# Altium schematic symbol library jlcpcb_2025_04_capacitors_extended_0603.schlib: 3668 symbols (part 6 of 20) (continued)
## AC0603JRNPO9BN151
designator C?  Capacitance: 150pF  (hidden comment: *)
Capacitor, Ceramic (MLCC), 150pF, ±5%, 50V, NP0, ±5%, SMD 0603; Manufacturer: YAGEO; Manufacturer Part Number: AC0603JRNPO9BN151; Package Size: 0603; JLCPCB Basic Part: No; JLCPCB Part Number: C327123; Supplier 1: LCSC; Category: Capacitors - MLCC; Supplier Part Number 1: C327123; Tolerance: ±5%; Voltage Rating: 50V; Temperature Coefficient: NP0; RoHS: Yes; ComponentLink1Description: Datasheet; ComponentLink1URL: https://wmsc.lcsc.com/wmsc/upload/file/pdf/v2/lcsc/1811141225_YAGEO-AC0603JRNPO9BN151_C327123.pdf; ComponentLink2Description: JLCPCB Part URL; ComponentLink2URL: https://jlcpcb.com/partdetail/C327123; ComponentLink3Description: LCSC Part URL; ComponentLink3URL: https://lcsc.com/product-detail/Multilayer-Ceramic-Capacitors-MLCC---SMD-SMT_YAGEO-YAGEO-AC0603JRNPO9BN151_C327123.html
footprint CAP-0603 (0603 (1608M) Capacitor)
pins: 1, 2

## AC0603JRNPO9BN160
designator C?  Capacitance: 16pF  (hidden comment: *)
Capacitor, Ceramic (MLCC), 16pF, ±5%, 50V, NP0, ±5%, SMD 0603; Manufacturer: YAGEO; Manufacturer Part Number: AC0603JRNPO9BN160; Package Size: 0603; JLCPCB Basic Part: No; JLCPCB Part Number: C726546; Supplier 1: LCSC; Category: Capacitors - MLCC; Supplier Part Number 1: C726546; Tolerance: ±5%; Voltage Rating: 50V; Temperature Coefficient: NP0; RoHS: Yes; ComponentLink1Description: Datasheet; ComponentLink1URL: https://wmsc.lcsc.com/wmsc/upload/file/pdf/v2/lcsc/2011091835_YAGEO-AC0603JRNPO9BN160_C726546.pdf; ComponentLink2Description: JLCPCB Part URL; ComponentLink2URL: https://jlcpcb.com/partdetail/C726546; ComponentLink3Description: LCSC Part URL; ComponentLink3URL: https://lcsc.com/product-detail/Multilayer-Ceramic-Capacitors-MLCC---SMD-SMT_YAGEO-YAGEO-AC0603JRNPO9BN160_C726546.html
footprint CAP-0603 (0603 (1608M) Capacitor)
pins: 1, 2

## AC0603JRNPO9BN180
designator C?  Capacitance: 18pF  (hidden comment: *)
Capacitor, Ceramic (MLCC), 18pF, ±5%, 50V, NP0, ±5%, SMD 0603; Manufacturer: YAGEO; Manufacturer Part Number: AC0603JRNPO9BN180; Package Size: 0603; JLCPCB Basic Part: No; JLCPCB Part Number: C389109; Supplier 1: LCSC; Category: Capacitors - MLCC; Supplier Part Number 1: C389109; Tolerance: ±5%; Voltage Rating: 50V; Temperature Coefficient: NP0; RoHS: Yes; ComponentLink1Description: Datasheet; ComponentLink1URL: https://wmsc.lcsc.com/wmsc/upload/file/pdf/v2/lcsc/1912111437_YAGEO-AC0603JRNPO9BN180_C389109.pdf; ComponentLink2Description: JLCPCB Part URL; ComponentLink2URL: https://jlcpcb.com/partdetail/C389109; ComponentLink3Description: LCSC Part URL; ComponentLink3URL: https://lcsc.com/product-detail/Multilayer-Ceramic-Capacitors-MLCC---SMD-SMT_YAGEO-YAGEO-AC0603JRNPO9BN180_C389109.html
footprint CAP-0603 (0603 (1608M) Capacitor)
pins: 1, 2

## AC0603JRNPO9BN181
designator C?  Capacitance: 180pF  (hidden comment: *)
Capacitor, Ceramic (MLCC), 180pF, ±5%, 50V, NP0, ±5%, SMD 0603; Manufacturer: YAGEO; Manufacturer Part Number: AC0603JRNPO9BN181; Package Size: 0603; JLCPCB Basic Part: No; JLCPCB Part Number: C2197070; Supplier 1: LCSC; Category: Capacitors - MLCC; Supplier Part Number 1: C2197070; Tolerance: ±5%; Voltage Rating: 50V; Temperature Coefficient: NP0; RoHS: Yes; ComponentLink1Description: Datasheet; ComponentLink1URL: https://wmsc.lcsc.com/wmsc/upload/file/pdf/v2/lcsc/2304140030_YAGEO-AC0603JRNPO9BN181_C2197070.pdf; ComponentLink2Description: JLCPCB Part URL; ComponentLink2URL: https://jlcpcb.com/partdetail/C2197070; ComponentLink3Description: LCSC Part URL; ComponentLink3URL: https://lcsc.com/product-detail/Multilayer-Ceramic-Capacitors-MLCC---SMD-SMT_YAGEO-YAGEO-AC0603JRNPO9BN181_C2197070.html
footprint CAP-0603 (0603 (1608M) Capacitor)
pins: 1, 2

## AC0603JRNPO9BN200
designator C?  Capacitance: 20pF  (hidden comment: *)
Capacitor, Ceramic (MLCC), 20pF, ±5%, 50V, NP0, ±5%, SMD 0603; Manufacturer: YAGEO; Manufacturer Part Number: AC0603JRNPO9BN200; Package Size: 0603; JLCPCB Basic Part: No; JLCPCB Part Number: C149610; Supplier 1: LCSC; Category: Capacitors - MLCC; Supplier Part Number 1: C149610; Tolerance: ±5%; Voltage Rating: 50V; Temperature Coefficient: NP0; RoHS: Yes; ComponentLink1Description: Datasheet; ComponentLink1URL: https://wmsc.lcsc.com/wmsc/upload/file/pdf/v2/lcsc/2304140030_YAGEO-AC0603JRNPO9BN200_C149610.pdf; ComponentLink2Description: JLCPCB Part URL; ComponentLink2URL: https://jlcpcb.com/partdetail/C149610; ComponentLink3Description: LCSC Part URL; ComponentLink3URL: https://lcsc.com/product-detail/Multilayer-Ceramic-Capacitors-MLCC---SMD-SMT_YAGEO-YAGEO-AC0603JRNPO9BN200_C149610.html
footprint CAP-0603 (0603 (1608M) Capacitor)
pins: 1, 2

## AC0603JRNPO9BN220
designator C?  Capacitance: 22pF  (hidden comment: *)
Capacitor, Ceramic (MLCC), 22pF, ±5%, 50V, NP0, ±5%, SMD 0603; Manufacturer: YAGEO; Manufacturer Part Number: AC0603JRNPO9BN220; Package Size: 0603; JLCPCB Basic Part: No; JLCPCB Part Number: C309441; Supplier 1: LCSC; Category: Capacitors - MLCC; Supplier Part Number 1: C309441; Tolerance: ±5%; Voltage Rating: 50V; Temperature Coefficient: NP0; RoHS: Yes; ComponentLink1Description: Datasheet; ComponentLink1URL: https://wmsc.lcsc.com/wmsc/upload/file/pdf/v2/lcsc/2304140030_YAGEO-AC0603JRNPO9BN220_C309441.pdf; ComponentLink2Description: JLCPCB Part URL; ComponentLink2URL: https://jlcpcb.com/partdetail/C309441; ComponentLink3Description: LCSC Part URL; ComponentLink3URL: https://lcsc.com/product-detail/Multilayer-Ceramic-Capacitors-MLCC---SMD-SMT_YAGEO-YAGEO-AC0603JRNPO9BN220_C309441.html
footprint CAP-0603 (0603 (1608M) Capacitor)
pins: 1, 2

## AC0603JRNPO9BN221
designator C?  Capacitance: 220pF  (hidden comment: *)
Capacitor, Ceramic (MLCC), 220pF, ±5%, 50V, NP0, ±5%, SMD 0603; Manufacturer: YAGEO; Manufacturer Part Number: AC0603JRNPO9BN221; Package Size: 0603; JLCPCB Basic Part: No; JLCPCB Part Number: C723993; Supplier 1: LCSC; Category: Capacitors - MLCC; Supplier Part Number 1: C723993; Tolerance: ±5%; Voltage Rating: 50V; Temperature Coefficient: NP0; RoHS: Yes; ComponentLink1Description: Datasheet; ComponentLink1URL: https://wmsc.lcsc.com/wmsc/upload/file/pdf/v2/lcsc/2009261809_YAGEO-AC0603JRNPO9BN221_C723993.pdf; ComponentLink2Description: JLCPCB Part URL; ComponentLink2URL: https://jlcpcb.com/partdetail/C723993; ComponentLink3Description: LCSC Part URL; ComponentLink3URL: https://lcsc.com/product-detail/Multilayer-Ceramic-Capacitors-MLCC---SMD-SMT_YAGEO-YAGEO-AC0603JRNPO9BN221_C723993.html
footprint CAP-0603 (0603 (1608M) Capacitor)
pins: 1, 2

## AC0603JRNPO9BN271
designator C?  Capacitance: 270pF  (hidden comment: *)
Capacitor, Ceramic (MLCC), 270pF, ±5%, 50V, NP0, ±5%, SMD 0603; Manufacturer: YAGEO; Manufacturer Part Number: AC0603JRNPO9BN271; Package Size: 0603; JLCPCB Basic Part: No; JLCPCB Part Number: C726547; Supplier 1: LCSC; Category: Capacitors - MLCC; Supplier Part Number 1: C726547; Tolerance: ±5%; Voltage Rating: 50V; Temperature Coefficient: NP0; RoHS: Yes; ComponentLink1Description: Datasheet; ComponentLink1URL: https://wmsc.lcsc.com/wmsc/upload/file/pdf/v2/lcsc/2009191609_YAGEO-AC0603JRNPO9BN271_C726547.pdf; ComponentLink2Description: JLCPCB Part URL; ComponentLink2URL: https://jlcpcb.com/partdetail/C726547; ComponentLink3Description: LCSC Part URL; ComponentLink3URL: https://lcsc.com/product-detail/Multilayer-Ceramic-Capacitors-MLCC---SMD-SMT_YAGEO-YAGEO-AC0603JRNPO9BN271_C726547.html
footprint CAP-0603 (0603 (1608M) Capacitor)
pins: 1, 2

## AC0603JRNPO9BN330
designator C?  Capacitance: 33pF  (hidden comment: *)
Capacitor, Ceramic (MLCC), 33pF, ±5%, 50V, NP0, ±5%, SMD 0603; Manufacturer: YAGEO; Manufacturer Part Number: AC0603JRNPO9BN330; Package Size: 0603; JLCPCB Basic Part: No; JLCPCB Part Number: C327017; Supplier 1: LCSC; Category: Capacitors - MLCC; Supplier Part Number 1: C327017; Tolerance: ±5%; Voltage Rating: 50V; Temperature Coefficient: NP0; RoHS: Yes; ComponentLink1Description: Datasheet; ComponentLink1URL: https://wmsc.lcsc.com/wmsc/upload/file/pdf/v2/lcsc/1811141225_YAGEO-AC0603JRNPO9BN330_C327017.pdf; ComponentLink2Description: JLCPCB Part URL; ComponentLink2URL: https://jlcpcb.com/partdetail/C327017; ComponentLink3Description: LCSC Part URL; ComponentLink3URL: https://lcsc.com/product-detail/Multilayer-Ceramic-Capacitors-MLCC---SMD-SMT_YAGEO-YAGEO-AC0603JRNPO9BN330_C327017.html
footprint CAP-0603 (0603 (1608M) Capacitor)
pins: 1, 2

## AC0603JRNPO9BN331
designator C?  Capacitance: 330pF  (hidden comment: *)
Capacitor, Ceramic (MLCC), 330pF, ±5%, 50V, NP0, ±5%, SMD 0603; Manufacturer: YAGEO; Manufacturer Part Number: AC0603JRNPO9BN331; Package Size: 0603; JLCPCB Basic Part: No; JLCPCB Part Number: C605209; Supplier 1: LCSC; Category: Capacitors - MLCC; Supplier Part Number 1: C605209; Tolerance: ±5%; Voltage Rating: 50V; Temperature Coefficient: NP0; RoHS: Yes; ComponentLink1Description: Datasheet; ComponentLink1URL: https://wmsc.lcsc.com/wmsc/upload/file/pdf/v2/lcsc/2304140030_YAGEO-AC0603JRNPO9BN331_C605209.pdf; ComponentLink2Description: JLCPCB Part URL; ComponentLink2URL: https://jlcpcb.com/partdetail/C605209; ComponentLink3Description: LCSC Part URL; ComponentLink3URL: https://lcsc.com/product-detail/Multilayer-Ceramic-Capacitors-MLCC---SMD-SMT_YAGEO-YAGEO-AC0603JRNPO9BN331_C605209.html
footprint CAP-0603 (0603 (1608M) Capacitor)
pins: 1, 2

## AC0603JRNPO9BN390
designator C?  Capacitance: 39pF  (hidden comment: *)
Capacitor, Ceramic (MLCC), 39pF, ±5%, 50V, NP0, ±5%, SMD 0603; Manufacturer: YAGEO; Manufacturer Part Number: AC0603JRNPO9BN390; Package Size: 0603; JLCPCB Basic Part: No; JLCPCB Part Number: C2180849; Supplier 1: LCSC; Category: Capacitors - MLCC; Supplier Part Number 1: C2180849; Tolerance: ±5%; Voltage Rating: 50V; Temperature Coefficient: NP0; RoHS: Yes; ComponentLink1Description: Datasheet; ComponentLink1URL: https://wmsc.lcsc.com/wmsc/upload/file/pdf/v2/lcsc/2202041130_YAGEO-AC0603JRNPO9BN390_C2180849.pdf; ComponentLink2Description: JLCPCB Part URL; ComponentLink2URL: https://jlcpcb.com/partdetail/C2180849; ComponentLink3Description: LCSC Part URL; ComponentLink3URL: https://lcsc.com/product-detail/Multilayer-Ceramic-Capacitors-MLCC---SMD-SMT_YAGEO-YAGEO-AC0603JRNPO9BN390_C2180849.html
footprint CAP-0603 (0603 (1608M) Capacitor)
pins: 1, 2

## AC0603JRNPO9BN391
designator C?  Capacitance: 390pF  (hidden comment: *)
Capacitor, Ceramic (MLCC), 390pF, ±5%, 50V, NP0, ±5%, SMD 0603; Manufacturer: YAGEO; Manufacturer Part Number: AC0603JRNPO9BN391; Package Size: 0603; JLCPCB Basic Part: No; JLCPCB Part Number: C327023; Supplier 1: LCSC; Category: Capacitors - MLCC; Supplier Part Number 1: C327023; Tolerance: ±5%; Voltage Rating: 50V; Temperature Coefficient: NP0; RoHS: Yes; ComponentLink1Description: Datasheet; ComponentLink1URL: https://wmsc.lcsc.com/wmsc/upload/file/pdf/v2/lcsc/1811141234_YAGEO-AC0603JRNPO9BN391_C327023.pdf; ComponentLink2Description: JLCPCB Part URL; ComponentLink2URL: https://jlcpcb.com/partdetail/C327023; ComponentLink3Description: LCSC Part URL; ComponentLink3URL: https://lcsc.com/product-detail/Multilayer-Ceramic-Capacitors-MLCC---SMD-SMT_YAGEO-YAGEO-AC0603JRNPO9BN391_C327023.html
footprint CAP-0603 (0603 (1608M) Capacitor)
pins: 1, 2

## AC0603JRNPO9BN470
designator C?  Capacitance: 47pF  (hidden comment: *)
Capacitor, Ceramic (MLCC), 47pF, ±5%, 50V, NP0, ±5%, SMD 0603; Manufacturer: YAGEO; Manufacturer Part Number: AC0603JRNPO9BN470; Package Size: 0603; JLCPCB Basic Part: No; JLCPCB Part Number: C149616; Supplier 1: LCSC; Category: Capacitors - MLCC; Supplier Part Number 1: C149616; Tolerance: ±5%; Voltage Rating: 50V; Temperature Coefficient: NP0; RoHS: Yes; ComponentLink1Description: Datasheet; ComponentLink1URL: https://wmsc.lcsc.com/wmsc/upload/file/pdf/v2/lcsc/2304140030_YAGEO-AC0603JRNPO9BN470_C149616.pdf; ComponentLink2Description: JLCPCB Part URL; ComponentLink2URL: https://jlcpcb.com/partdetail/C149616; ComponentLink3Description: LCSC Part URL; ComponentLink3URL: https://lcsc.com/product-detail/Multilayer-Ceramic-Capacitors-MLCC---SMD-SMT_YAGEO-YAGEO-AC0603JRNPO9BN470_C149616.html
footprint CAP-0603 (0603 (1608M) Capacitor)
pins: 1, 2

## AC0603JRNPO9BN471
designator C?  Capacitance: 470pF  (hidden comment: *)
Capacitor, Ceramic (MLCC), 470pF, ±5%, 50V, NP0, ±5%, SMD 0603; Manufacturer: YAGEO; Manufacturer Part Number: AC0603JRNPO9BN471; Package Size: 0603; JLCPCB Basic Part: No; JLCPCB Part Number: C326950; Supplier 1: LCSC; Category: Capacitors - MLCC; Supplier Part Number 1: C326950; Tolerance: ±5%; Voltage Rating: 50V; Temperature Coefficient: NP0; RoHS: Yes; ComponentLink1Description: Datasheet; ComponentLink1URL: https://wmsc.lcsc.com/wmsc/upload/file/pdf/v2/lcsc/1811141226_YAGEO-AC0603JRNPO9BN471_C326950.pdf; ComponentLink2Description: JLCPCB Part URL; ComponentLink2URL: https://jlcpcb.com/partdetail/C326950; ComponentLink3Description: LCSC Part URL; ComponentLink3URL: https://lcsc.com/product-detail/Multilayer-Ceramic-Capacitors-MLCC---SMD-SMT_YAGEO-YAGEO-AC0603JRNPO9BN471_C326950.html
footprint CAP-0603 (0603 (1608M) Capacitor)
pins: 1, 2

## AC0603JRNPO9BN560
designator C?  Capacitance: 56pF  (hidden comment: *)
Capacitor, Ceramic (MLCC), 56pF, ±5%, 50V, NP0, ±5%, SMD 0603; Manufacturer: YAGEO; Manufacturer Part Number: AC0603JRNPO9BN560; Package Size: 0603; JLCPCB Basic Part: No; JLCPCB Part Number: C2191164; Supplier 1: LCSC; Category: Capacitors - MLCC; Supplier Part Number 1: C2191164; Tolerance: ±5%; Voltage Rating: 50V; Temperature Coefficient: NP0; RoHS: Yes; ComponentLink1Description: Datasheet; ComponentLink1URL: https://wmsc.lcsc.com/wmsc/upload/file/pdf/v2/lcsc/2304140030_YAGEO-AC0603JRNPO9BN560_C2191164.pdf; ComponentLink2Description: JLCPCB Part URL; ComponentLink2URL: https://jlcpcb.com/partdetail/C2191164; ComponentLink3Description: LCSC Part URL; ComponentLink3URL: https://lcsc.com/product-detail/Multilayer-Ceramic-Capacitors-MLCC---SMD-SMT_YAGEO-YAGEO-AC0603JRNPO9BN560_C2191164.html
footprint CAP-0603 (0603 (1608M) Capacitor)
pins: 1, 2

## AC0603JRNPO9BN561
designator C?  Capacitance: 560pF  (hidden comment: *)
Capacitor, Ceramic (MLCC), 560pF, ±5%, 50V, NP0, ±5%, SMD 0603; Manufacturer: YAGEO; Manufacturer Part Number: AC0603JRNPO9BN561; Package Size: 0603; JLCPCB Basic Part: No; JLCPCB Part Number: C726548; Supplier 1: LCSC; Category: Capacitors - MLCC; Supplier Part Number 1: C726548; Tolerance: ±5%; Voltage Rating: 50V; Temperature Coefficient: NP0; RoHS: Yes; ComponentLink1Description: Datasheet; ComponentLink1URL: https://wmsc.lcsc.com/wmsc/upload/file/pdf/v2/lcsc/2009181007_YAGEO-AC0603JRNPO9BN561_C726548.pdf; ComponentLink2Description: JLCPCB Part URL; ComponentLink2URL: https://jlcpcb.com/partdetail/C726548; ComponentLink3Description: LCSC Part URL; ComponentLink3URL: https://lcsc.com/product-detail/Multilayer-Ceramic-Capacitors-MLCC---SMD-SMT_YAGEO-YAGEO-AC0603JRNPO9BN561_C726548.html
footprint CAP-0603 (0603 (1608M) Capacitor)
pins: 1, 2

## AC0603JRNPO9BN681
designator C?  Capacitance: 680pF  (hidden comment: *)
Capacitor, Ceramic (MLCC), 680pF, ±5%, 50V, NP0, ±5%, SMD 0603; Manufacturer: YAGEO; Manufacturer Part Number: AC0603JRNPO9BN681; Package Size: 0603; JLCPCB Basic Part: No; JLCPCB Part Number: C726549; Supplier 1: LCSC; Category: Capacitors - MLCC; Supplier Part Number 1: C726549; Tolerance: ±5%; Voltage Rating: 50V; Temperature Coefficient: NP0; RoHS: Yes; ComponentLink1Description: Datasheet; ComponentLink1URL: https://wmsc.lcsc.com/wmsc/upload/file/pdf/v2/lcsc/2009181007_YAGEO-AC0603JRNPO9BN681_C726549.pdf; ComponentLink2Description: JLCPCB Part URL; ComponentLink2URL: https://jlcpcb.com/partdetail/C726549; ComponentLink3Description: LCSC Part URL; ComponentLink3URL: https://lcsc.com/product-detail/Multilayer-Ceramic-Capacitors-MLCC---SMD-SMT_YAGEO-YAGEO-AC0603JRNPO9BN681_C726549.html
footprint CAP-0603 (0603 (1608M) Capacitor)
pins: 1, 2

## AC0603JRNPOYBN101
designator C?  Capacitance: 100pF  (hidden comment: *)
Capacitor, Ceramic (MLCC), 100pF, ±5%, 250V, NP0, ±5%, SMD 0603; Manufacturer: YAGEO; Manufacturer Part Number: AC0603JRNPOYBN101; Package Size: 0603; JLCPCB Basic Part: No; JLCPCB Part Number: C726550; Supplier 1: LCSC; Category: Capacitors - MLCC; Supplier Part Number 1: C726550; Tolerance: ±5%; Voltage Rating: 250V; Temperature Coefficient: NP0; RoHS: Yes; ComponentLink1Description: Datasheet; ComponentLink1URL: https://wmsc.lcsc.com/wmsc/upload/file/pdf/v2/lcsc/2010041434_YAGEO-AC0603JRNPOYBN101_C726550.pdf; ComponentLink2Description: JLCPCB Part URL; ComponentLink2URL: https://jlcpcb.com/partdetail/C726550; ComponentLink3Description: LCSC Part URL; ComponentLink3URL: https://lcsc.com/product-detail/Multilayer-Ceramic-Capacitors-MLCC---SMD-SMT_YAGEO-YAGEO-AC0603JRNPOYBN101_C726550.html
footprint CAP-0603 (0603 (1608M) Capacitor)
pins: 1, 2

## AC0603JRNPOYBN151
designator C?  Capacitance: 150pF  (hidden comment: *)
Capacitor, Ceramic (MLCC), 150pF, ±5%, 250V, C0G, ±5%, SMD 0603; Manufacturer: YAGEO; Manufacturer Part Number: AC0603JRNPOYBN151; Package Size: 0603; JLCPCB Basic Part: No; JLCPCB Part Number: C3842058; Supplier 1: LCSC; Category: Capacitors - MLCC; Supplier Part Number 1: C3842058; Tolerance: ±5%; Voltage Rating: 250V; Temperature Coefficient: C0G; RoHS: Yes; ComponentLink1Description: Datasheet; ComponentLink1URL: https://wmsc.lcsc.com/wmsc/upload/file/pdf/v2/lcsc/2311211113_YAGEO-AC0603JRNPOYBN151_C3842058.pdf; ComponentLink2Description: JLCPCB Part URL; ComponentLink2URL: https://jlcpcb.com/partdetail/C3842058; ComponentLink3Description: LCSC Part URL; ComponentLink3URL: https://lcsc.com/product-detail/Multilayer-Ceramic-Capacitors-MLCC---SMD-SMT_YAGEO-YAGEO-AC0603JRNPOYBN151_C3842058.html
footprint CAP-0603 (0603 (1608M) Capacitor)
pins: 1, 2

## AC0603JRNPOYBN681
designator C?  Capacitance: 680pF  (hidden comment: *)
Capacitor, Ceramic (MLCC), 680pF, ±5%, 250V, NP0, ±5%, SMD 0603; Manufacturer: YAGEO; Manufacturer Part Number: AC0603JRNPOYBN681; Package Size: 0603; JLCPCB Basic Part: No; JLCPCB Part Number: C2202951; Supplier 1: LCSC; Category: Capacitors - MLCC; Supplier Part Number 1: C2202951; Tolerance: ±5%; Voltage Rating: 250V; Temperature Coefficient: NP0; RoHS: Yes; ComponentLink1Description: Datasheet; ComponentLink1URL: https://wmsc.lcsc.com/wmsc/upload/file/pdf/v2/lcsc/2304140030_YAGEO-AC0603JRNPOYBN681_C2202951.pdf; ComponentLink2Description: JLCPCB Part URL; ComponentLink2URL: https://jlcpcb.com/partdetail/C2202951; ComponentLink3Description: LCSC Part URL; ComponentLink3URL: https://lcsc.com/product-detail/Multilayer-Ceramic-Capacitors-MLCC---SMD-SMT_YAGEO-YAGEO-AC0603JRNPOYBN681_C2202951.html
footprint CAP-0603 (0603 (1608M) Capacitor)
pins: 1, 2

## AC0603JRX7R9BB102
designator C?  Capacitance: 1nF  (hidden comment: *)
Capacitor, Ceramic (MLCC), 1nF, ±5%, 50V, X7R, ±5%, SMD 0603; Manufacturer: YAGEO; Manufacturer Part Number: AC0603JRX7R9BB102; Package Size: 0603; JLCPCB Basic Part: No; JLCPCB Part Number: C605214; Supplier 1: LCSC; Category: Capacitors - MLCC; Supplier Part Number 1: C605214; Tolerance: ±5%; Voltage Rating: 50V; Temperature Coefficient: X7R; RoHS: Yes; ComponentLink1Description: Datasheet; ComponentLink1URL: https://wmsc.lcsc.com/wmsc/upload/file/pdf/v2/lcsc/2304140030_YAGEO-AC0603JRX7R9BB102_C605214.pdf; ComponentLink2Description: JLCPCB Part URL; ComponentLink2URL: https://jlcpcb.com/partdetail/C605214; ComponentLink3Description: LCSC Part URL; ComponentLink3URL: https://lcsc.com/product-detail/Multilayer-Ceramic-Capacitors-MLCC---SMD-SMT_YAGEO-YAGEO-AC0603JRX7R9BB102_C605214.html
footprint CAP-0603 (0603 (1608M) Capacitor)
pins: 1, 2

## AC0603JRX7R9BB103
designator C?  Capacitance: 10nF  (hidden comment: *)
Capacitor, Ceramic (MLCC), 10nF, ±5%, 50V, X7R, ±5%, SMD 0603; Manufacturer: YAGEO; Manufacturer Part Number: AC0603JRX7R9BB103; Package Size: 0603; JLCPCB Basic Part: No; JLCPCB Part Number: C605212; Supplier 1: LCSC; Category: Capacitors - MLCC; Supplier Part Number 1: C605212; Tolerance: ±5%; Voltage Rating: 50V; Temperature Coefficient: X7R; RoHS: Yes; ComponentLink1Description: Datasheet; ComponentLink1URL: https://wmsc.lcsc.com/wmsc/upload/file/pdf/v2/lcsc/2304140030_YAGEO-AC0603JRX7R9BB103_C605212.pdf; ComponentLink2Description: JLCPCB Part URL; ComponentLink2URL: https://jlcpcb.com/partdetail/C605212; ComponentLink3Description: LCSC Part URL; ComponentLink3URL: https://lcsc.com/product-detail/Multilayer-Ceramic-Capacitors-MLCC---SMD-SMT_YAGEO-YAGEO-AC0603JRX7R9BB103_C605212.html
footprint CAP-0603 (0603 (1608M) Capacitor)
pins: 1, 2

## AC0603JRX7R9BB104
designator C?  Capacitance: 100nF  (hidden comment: *)
Capacitor, Ceramic (MLCC), 100nF, ±5%, 50V, X7R, ±5%, SMD 0603; Manufacturer: YAGEO; Manufacturer Part Number: AC0603JRX7R9BB104; Package Size: 0603; JLCPCB Basic Part: No; JLCPCB Part Number: C605211; Supplier 1: LCSC; Category: Capacitors - MLCC; Supplier Part Number 1: C605211; Tolerance: ±5%; Voltage Rating: 50V; Temperature Coefficient: X7R; RoHS: Yes; ComponentLink1Description: Datasheet; ComponentLink1URL: https://wmsc.lcsc.com/wmsc/upload/file/pdf/v2/lcsc/2304140030_YAGEO-AC0603JRX7R9BB104_C605211.pdf; ComponentLink2Description: JLCPCB Part URL; ComponentLink2URL: https://jlcpcb.com/partdetail/C605211; ComponentLink3Description: LCSC Part URL; ComponentLink3URL: https://lcsc.com/product-detail/Multilayer-Ceramic-Capacitors-MLCC---SMD-SMT_YAGEO-YAGEO-AC0603JRX7R9BB104_C605211.html
footprint CAP-0603 (0603 (1608M) Capacitor)
pins: 1, 2

## AC0603JRX7R9BB222
designator C?  Capacitance: 2.2nF  (hidden comment: *)
Capacitor, Ceramic (MLCC), 2.2nF, ±5%, 50V, X7R, ±5%, SMD 0603; Manufacturer: YAGEO; Manufacturer Part Number: AC0603JRX7R9BB222; Package Size: 0603; JLCPCB Basic Part: No; JLCPCB Part Number: C326975; Supplier 1: LCSC; Category: Capacitors - MLCC; Supplier Part Number 1: C326975; Tolerance: ±5%; Voltage Rating: 50V; Temperature Coefficient: X7R; RoHS: Yes; ComponentLink1Description: Datasheet; ComponentLink1URL: https://wmsc.lcsc.com/wmsc/upload/file/pdf/v2/lcsc/2304140030_YAGEO-AC0603JRX7R9BB222_C326975.pdf; ComponentLink2Description: JLCPCB Part URL; ComponentLink2URL: https://jlcpcb.com/partdetail/C326975; ComponentLink3Description: LCSC Part URL; ComponentLink3URL: https://lcsc.com/product-detail/Multilayer-Ceramic-Capacitors-MLCC---SMD-SMT_YAGEO-YAGEO-AC0603JRX7R9BB222_C326975.html
footprint CAP-0603 (0603 (1608M) Capacitor)
pins: 1, 2

## AC0603JRX7R9BB223
designator C?  Capacitance: 22nF  (hidden comment: *)
Capacitor, Ceramic (MLCC), 22nF, ±5%, 50V, X7R, ±5%, SMD 0603; Manufacturer: YAGEO; Manufacturer Part Number: AC0603JRX7R9BB223; Package Size: 0603; JLCPCB Basic Part: No; JLCPCB Part Number: C605216; Supplier 1: LCSC; Category: Capacitors - MLCC; Supplier Part Number 1: C605216; Tolerance: ±5%; Voltage Rating: 50V; Temperature Coefficient: X7R; RoHS: Yes; ComponentLink1Description: Datasheet; ComponentLink1URL: https://wmsc.lcsc.com/wmsc/upload/file/pdf/v2/lcsc/2304140030_YAGEO-AC0603JRX7R9BB223_C605216.pdf; ComponentLink2Description: JLCPCB Part URL; ComponentLink2URL: https://jlcpcb.com/partdetail/C605216; ComponentLink3Description: LCSC Part URL; ComponentLink3URL: https://lcsc.com/product-detail/Multilayer-Ceramic-Capacitors-MLCC---SMD-SMT_YAGEO-YAGEO-AC0603JRX7R9BB223_C605216.html
footprint CAP-0603 (0603 (1608M) Capacitor)
pins: 1, 2

## AC0603JRX7R9BB332
designator C?  Capacitance: 3.3nF  (hidden comment: *)
Capacitor, Ceramic (MLCC), 3.3nF, ±5%, 50V, X7R, ±5%, SMD 0603; Manufacturer: YAGEO; Manufacturer Part Number: AC0603JRX7R9BB332; Package Size: 0603; JLCPCB Basic Part: No; JLCPCB Part Number: C605215; Supplier 1: LCSC; Category: Capacitors - MLCC; Supplier Part Number 1: C605215; Tolerance: ±5%; Voltage Rating: 50V; Temperature Coefficient: X7R; RoHS: Yes; ComponentLink1Description: Datasheet; ComponentLink1URL: https://wmsc.lcsc.com/wmsc/upload/file/pdf/v2/lcsc/2304140030_YAGEO-AC0603JRX7R9BB332_C605215.pdf; ComponentLink2Description: JLCPCB Part URL; ComponentLink2URL: https://jlcpcb.com/partdetail/C605215; ComponentLink3Description: LCSC Part URL; ComponentLink3URL: https://lcsc.com/product-detail/Multilayer-Ceramic-Capacitors-MLCC---SMD-SMT_YAGEO-YAGEO-AC0603JRX7R9BB332_C605215.html
footprint CAP-0603 (0603 (1608M) Capacitor)
pins: 1, 2

## AC0603KRX7R0BB102
designator C?  Capacitance: 1nF  (hidden comment: *)
Capacitor, Ceramic (MLCC), 1nF, ±10%, 100V, X7R, ±10%, SMD 0603; Manufacturer: YAGEO; Manufacturer Part Number: AC0603KRX7R0BB102; Package Size: 0603; JLCPCB Basic Part: No; JLCPCB Part Number: C726551; Supplier 1: LCSC; Category: Capacitors - MLCC; Supplier Part Number 1: C726551; Tolerance: ±10%; Voltage Rating: 100V; Temperature Coefficient: X7R; RoHS: Yes; ComponentLink1Description: Datasheet; ComponentLink1URL: https://wmsc.lcsc.com/wmsc/upload/file/pdf/v2/lcsc/2009181007_YAGEO-AC0603KRX7R0BB102_C726551.pdf; ComponentLink2Description: JLCPCB Part URL; ComponentLink2URL: https://jlcpcb.com/partdetail/C726551; ComponentLink3Description: LCSC Part URL; ComponentLink3URL: https://lcsc.com/product-detail/Multilayer-Ceramic-Capacitors-MLCC---SMD-SMT_YAGEO-YAGEO-AC0603KRX7R0BB102_C726551.html
footprint CAP-0603 (0603 (1608M) Capacitor)
pins: 1, 2

## AC0603KRX7R0BB103
designator C?  Capacitance: 10nF  (hidden comment: *)
Capacitor, Ceramic (MLCC), 10nF, ±10%, 100V, X7R, ±10%, SMD 0603; Manufacturer: YAGEO; Manufacturer Part Number: AC0603KRX7R0BB103; Package Size: 0603; JLCPCB Basic Part: No; JLCPCB Part Number: C149602; Supplier 1: LCSC; Category: Capacitors - MLCC; Supplier Part Number 1: C149602; Tolerance: ±10%; Voltage Rating: 100V; Temperature Coefficient: X7R; RoHS: Yes; ComponentLink1Description: Datasheet; ComponentLink1URL: https://wmsc.lcsc.com/wmsc/upload/file/pdf/v2/lcsc/2304140030_YAGEO-AC0603KRX7R0BB103_C149602.pdf; ComponentLink2Description: JLCPCB Part URL; ComponentLink2URL: https://jlcpcb.com/partdetail/C149602; ComponentLink3Description: LCSC Part URL; ComponentLink3URL: https://lcsc.com/product-detail/Multilayer-Ceramic-Capacitors-MLCC---SMD-SMT_YAGEO-YAGEO-AC0603KRX7R0BB103_C149602.html
footprint CAP-0603 (0603 (1608M) Capacitor)
pins: 1, 2

## AC0603KRX7R0BB104
designator C?  Capacitance: 100nF  (hidden comment: *)
Capacitor, Ceramic (MLCC), 100nF, ±10%, 100V, X7R, ±10%, SMD 0603; Manufacturer: YAGEO; Manufacturer Part Number: AC0603KRX7R0BB104; Package Size: 0603; JLCPCB Basic Part: No; JLCPCB Part Number: C408909; Supplier 1: LCSC; Category: Capacitors - MLCC; Supplier Part Number 1: C408909; Tolerance: ±10%; Voltage Rating: 100V; Temperature Coefficient: X7R; RoHS: Yes; ComponentLink1Description: Datasheet; ComponentLink1URL: https://wmsc.lcsc.com/wmsc/upload/file/pdf/v2/lcsc/1912111437_YAGEO-AC0603KRX7R0BB104_C408909.pdf; ComponentLink2Description: JLCPCB Part URL; ComponentLink2URL: https://jlcpcb.com/partdetail/C408909; ComponentLink3Description: LCSC Part URL; ComponentLink3URL: https://lcsc.com/product-detail/Multilayer-Ceramic-Capacitors-MLCC---SMD-SMT_YAGEO-YAGEO-AC0603KRX7R0BB104_C408909.html
footprint CAP-0603 (0603 (1608M) Capacitor)
pins: 1, 2

## AC0603KRX7R0BB222
designator C?  Capacitance: 2.2nF  (hidden comment: *)
Capacitor, Ceramic (MLCC), 2.2nF, ±10%, 100V, X7R, ±10%, SMD 0603; Manufacturer: YAGEO; Manufacturer Part Number: AC0603KRX7R0BB222; Package Size: 0603; JLCPCB Basic Part: No; JLCPCB Part Number: C726552; Supplier 1: LCSC; Category: Capacitors - MLCC; Supplier Part Number 1: C726552; Tolerance: ±10%; Voltage Rating: 100V; Temperature Coefficient: X7R; RoHS: Yes; ComponentLink1Description: Datasheet; ComponentLink1URL: https://wmsc.lcsc.com/wmsc/upload/file/pdf/v2/lcsc/2009181007_YAGEO-AC0603KRX7R0BB222_C726552.pdf; ComponentLink2Description: JLCPCB Part URL; ComponentLink2URL: https://jlcpcb.com/partdetail/C726552; ComponentLink3Description: LCSC Part URL; ComponentLink3URL: https://lcsc.com/product-detail/Multilayer-Ceramic-Capacitors-MLCC---SMD-SMT_YAGEO-YAGEO-AC0603KRX7R0BB222_C726552.html
footprint CAP-0603 (0603 (1608M) Capacitor)
pins: 1, 2

## AC0603KRX7R0BB223
designator C?  Capacitance: 22nF  (hidden comment: *)
Capacitor, Ceramic (MLCC), 22nF, ±10%, 100V, X7R, ±10%, SMD 0603; Manufacturer: YAGEO; Manufacturer Part Number: AC0603KRX7R0BB223; Package Size: 0603; JLCPCB Basic Part: No; JLCPCB Part Number: C726553; Supplier 1: LCSC; Category: Capacitors - MLCC; Supplier Part Number 1: C726553; Tolerance: ±10%; Voltage Rating: 100V; Temperature Coefficient: X7R; RoHS: Yes; ComponentLink1Description: Datasheet; ComponentLink1URL: https://wmsc.lcsc.com/wmsc/upload/file/pdf/v2/lcsc/2009181007_YAGEO-AC0603KRX7R0BB223_C726553.pdf; ComponentLink2Description: JLCPCB Part URL; ComponentLink2URL: https://jlcpcb.com/partdetail/C726553; ComponentLink3Description: LCSC Part URL; ComponentLink3URL: https://lcsc.com/product-detail/Multilayer-Ceramic-Capacitors-MLCC---SMD-SMT_YAGEO-YAGEO-AC0603KRX7R0BB223_C726553.html
footprint CAP-0603 (0603 (1608M) Capacitor)
pins: 1, 2

## AC0603KRX7R0BB332
designator C?  Capacitance: 3.3nF  (hidden comment: *)
Capacitor, Ceramic (MLCC), 3.3nF, ±10%, 100V, X7R, ±10%, SMD 0603; Manufacturer: YAGEO; Manufacturer Part Number: AC0603KRX7R0BB332; Package Size: 0603; JLCPCB Basic Part: No; JLCPCB Part Number: C2195518; Supplier 1: LCSC; Category: Capacitors - MLCC; Supplier Part Number 1: C2195518; Tolerance: ±10%; Voltage Rating: 100V; Temperature Coefficient: X7R; RoHS: Yes; ComponentLink1Description: Datasheet; ComponentLink1URL: https://wmsc.lcsc.com/wmsc/upload/file/pdf/v2/lcsc/2304140030_YAGEO-AC0603KRX7R0BB332_C2195518.pdf; ComponentLink2Description: JLCPCB Part URL; ComponentLink2URL: https://jlcpcb.com/partdetail/C2195518; ComponentLink3Description: LCSC Part URL; ComponentLink3URL: https://lcsc.com/product-detail/Multilayer-Ceramic-Capacitors-MLCC---SMD-SMT_YAGEO-YAGEO-AC0603KRX7R0BB332_C2195518.html
footprint CAP-0603 (0603 (1608M) Capacitor)
pins: 1, 2

## AC0603KRX7R0BB472
designator C?  Capacitance: 4.7nF  (hidden comment: *)
Capacitor, Ceramic (MLCC), 4.7nF, ±10%, 100V, X7R, ±10%, SMD 0603; Manufacturer: YAGEO; Manufacturer Part Number: AC0603KRX7R0BB472; Package Size: 0603; JLCPCB Basic Part: No; JLCPCB Part Number: C327158; Supplier 1: LCSC; Category: Capacitors - MLCC; Supplier Part Number 1: C327158; Tolerance: ±10%; Voltage Rating: 100V; Temperature Coefficient: X7R; RoHS: Yes; ComponentLink1Description: Datasheet; ComponentLink1URL: https://wmsc.lcsc.com/wmsc/upload/file/pdf/v2/lcsc/1811141226_YAGEO-AC0603KRX7R0BB472_C327158.pdf; ComponentLink2Description: JLCPCB Part URL; ComponentLink2URL: https://jlcpcb.com/partdetail/C327158; ComponentLink3Description: LCSC Part URL; ComponentLink3URL: https://lcsc.com/product-detail/Multilayer-Ceramic-Capacitors-MLCC---SMD-SMT_YAGEO-YAGEO-AC0603KRX7R0BB472_C327158.html
footprint CAP-0603 (0603 (1608M) Capacitor)
pins: 1, 2

## AC0603KRX7R0BB473
designator C?  Capacitance: 47nF  (hidden comment: *)
Capacitor, Ceramic (MLCC), 47nF, ±10%, 100V, X7R, ±10%, SMD 0603; Manufacturer: YAGEO; Manufacturer Part Number: AC0603KRX7R0BB473; Package Size: 0603; JLCPCB Basic Part: No; JLCPCB Part Number: C469624; Supplier 1: LCSC; Category: Capacitors - MLCC; Supplier Part Number 1: C469624; Tolerance: ±10%; Voltage Rating: 100V; Temperature Coefficient: X7R; RoHS: Yes; ComponentLink1Description: Datasheet; ComponentLink1URL: https://wmsc.lcsc.com/wmsc/upload/file/pdf/v2/lcsc/1912210906_YAGEO-AC0603KRX7R0BB473_C469624.pdf; ComponentLink2Description: JLCPCB Part URL; ComponentLink2URL: https://jlcpcb.com/partdetail/C469624; ComponentLink3Description: LCSC Part URL; ComponentLink3URL: https://lcsc.com/product-detail/Multilayer-Ceramic-Capacitors-MLCC---SMD-SMT_YAGEO-YAGEO-AC0603KRX7R0BB473_C469624.html
footprint CAP-0603 (0603 (1608M) Capacitor)
pins: 1, 2

## AC0603KRX7R6BB105
designator C?  Capacitance: 1uF  (hidden comment: *)
Capacitor, Ceramic (MLCC), 1uF, ±10%, 10V, X7R, ±10%, SMD 0603; Manufacturer: YAGEO; Manufacturer Part Number: AC0603KRX7R6BB105; Package Size: 0603; JLCPCB Basic Part: No; JLCPCB Part Number: C726554; Supplier 1: LCSC; Category: Capacitors - MLCC; Supplier Part Number 1: C726554; Tolerance: ±10%; Voltage Rating: 10V; Temperature Coefficient: X7R; RoHS: Yes; ComponentLink1Description: Datasheet; ComponentLink1URL: https://wmsc.lcsc.com/wmsc/upload/file/pdf/v2/lcsc/2009191609_YAGEO-AC0603KRX7R6BB105_C726554.pdf; ComponentLink2Description: JLCPCB Part URL; ComponentLink2URL: https://jlcpcb.com/partdetail/C726554; ComponentLink3Description: LCSC Part URL; ComponentLink3URL: https://lcsc.com/product-detail/Multilayer-Ceramic-Capacitors-MLCC---SMD-SMT_YAGEO-YAGEO-AC0603KRX7R6BB105_C726554.html
footprint CAP-0603 (0603 (1608M) Capacitor)
pins: 1, 2

## AC0603KRX7R6BB224
designator C?  Capacitance: 220nF  (hidden comment: *)
Capacitor, Ceramic (MLCC), 220nF, ±10%, 10V, X7R, ±10%, SMD 0603; Manufacturer: YAGEO; Manufacturer Part Number: AC0603KRX7R6BB224; Package Size: 0603; JLCPCB Basic Part: No; JLCPCB Part Number: C2180937; Supplier 1: LCSC; Category: Capacitors - MLCC; Supplier Part Number 1: C2180937; Tolerance: ±10%; Voltage Rating: 10V; Temperature Coefficient: X7R; RoHS: Yes; ComponentLink1Description: Datasheet; ComponentLink1URL: https://wmsc.lcsc.com/wmsc/upload/file/pdf/v2/lcsc/2202041200_YAGEO-AC0603KRX7R6BB224_C2180937.pdf; ComponentLink2Description: JLCPCB Part URL; ComponentLink2URL: https://jlcpcb.com/partdetail/C2180937; ComponentLink3Description: LCSC Part URL; ComponentLink3URL: https://lcsc.com/product-detail/Multilayer-Ceramic-Capacitors-MLCC---SMD-SMT_YAGEO-YAGEO-AC0603KRX7R6BB224_C2180937.html
footprint CAP-0603 (0603 (1608M) Capacitor)
pins: 1, 2

## AC0603KRX7R7BB102
designator C?  Capacitance: 1nF  (hidden comment: *)
Capacitor, Ceramic (MLCC), 1nF, ±10%, 16V, X7R, ±10%, SMD 0603; Manufacturer: YAGEO; Manufacturer Part Number: AC0603KRX7R7BB102; Package Size: 0603; JLCPCB Basic Part: No; JLCPCB Part Number: C2180956; Supplier 1: LCSC; Category: Capacitors - MLCC; Supplier Part Number 1: C2180956; Tolerance: ±10%; Voltage Rating: 16V; Temperature Coefficient: X7R; RoHS: Yes; ComponentLink1Description: Datasheet; ComponentLink1URL: https://wmsc.lcsc.com/wmsc/upload/file/pdf/v2/lcsc/2202041200_YAGEO-AC0603KRX7R7BB102_C2180956.pdf; ComponentLink2Description: JLCPCB Part URL; ComponentLink2URL: https://jlcpcb.com/partdetail/C2180956; ComponentLink3Description: LCSC Part URL; ComponentLink3URL: https://lcsc.com/product-detail/Multilayer-Ceramic-Capacitors-MLCC---SMD-SMT_YAGEO-YAGEO-AC0603KRX7R7BB102_C2180956.html
footprint CAP-0603 (0603 (1608M) Capacitor)
pins: 1, 2

## AC0603KRX7R7BB103
designator C?  Capacitance: 10nF  (hidden comment: *)
Capacitor, Ceramic (MLCC), 10nF, ±10%, 16V, X7R, ±10%, SMD 0603; Manufacturer: YAGEO; Manufacturer Part Number: AC0603KRX7R7BB103; Package Size: 0603; JLCPCB Basic Part: No; JLCPCB Part Number: C149619; Supplier 1: LCSC; Category: Capacitors - MLCC; Supplier Part Number 1: C149619; Tolerance: ±10%; Voltage Rating: 16V; Temperature Coefficient: X7R; RoHS: Yes; ComponentLink1Description: Datasheet; ComponentLink1URL: https://wmsc.lcsc.com/wmsc/upload/file/pdf/v2/lcsc/2311211113_YAGEO-AC0603KRX7R7BB103_C149619.pdf; ComponentLink2Description: JLCPCB Part URL; ComponentLink2URL: https://jlcpcb.com/partdetail/C149619; ComponentLink3Description: LCSC Part URL; ComponentLink3URL: https://lcsc.com/product-detail/Multilayer-Ceramic-Capacitors-MLCC---SMD-SMT_YAGEO-YAGEO-AC0603KRX7R7BB103_C149619.html
footprint CAP-0603 (0603 (1608M) Capacitor)
pins: 1, 2

## AC0603KRX7R7BB104
designator C?  Capacitance: 100nF  (hidden comment: *)
Capacitor, Ceramic (MLCC), 100nF, ±10%, 16V, X7R, ±10%, SMD 0603; Manufacturer: YAGEO; Manufacturer Part Number: AC0603KRX7R7BB104; Package Size: 0603; JLCPCB Basic Part: No; JLCPCB Part Number: C149621; Supplier 1: LCSC; Category: Capacitors - MLCC; Supplier Part Number 1: C149621; Tolerance: ±10%; Voltage Rating: 16V; Temperature Coefficient: X7R; RoHS: Yes; ComponentLink1Description: Datasheet; ComponentLink1URL: https://wmsc.lcsc.com/wmsc/upload/file/pdf/v2/lcsc/2311211113_YAGEO-AC0603KRX7R7BB104_C149621.pdf; ComponentLink2Description: JLCPCB Part URL; ComponentLink2URL: https://jlcpcb.com/partdetail/C149621; ComponentLink3Description: LCSC Part URL; ComponentLink3URL: https://lcsc.com/product-detail/Multilayer-Ceramic-Capacitors-MLCC---SMD-SMT_YAGEO-YAGEO-AC0603KRX7R7BB104_C149621.html
footprint CAP-0603 (0603 (1608M) Capacitor)
pins: 1, 2

## AC0603KRX7R7BB105
designator C?  Capacitance: 1uF  (hidden comment: *)
Capacitor, Ceramic (MLCC), 1uF, ±10%, 16V, X7R, ±10%, SMD 0603; Manufacturer: YAGEO; Manufacturer Part Number: AC0603KRX7R7BB105; Package Size: 0603; JLCPCB Basic Part: No; JLCPCB Part Number: C3905328; Supplier 1: LCSC; Category: Capacitors - MLCC; Supplier Part Number 1: C3905328; Tolerance: ±10%; Voltage Rating: 16V; Temperature Coefficient: X7R; RoHS: Yes; ComponentLink1Description: Datasheet; ComponentLink1URL: https://wmsc.lcsc.com/wmsc/upload/file/pdf/v2/lcsc/2311211113_YAGEO-AC0603KRX7R7BB105_C3905328.pdf; ComponentLink2Description: JLCPCB Part URL; ComponentLink2URL: https://jlcpcb.com/partdetail/C3905328; ComponentLink3Description: LCSC Part URL; ComponentLink3URL: https://lcsc.com/product-detail/Multilayer-Ceramic-Capacitors-MLCC---SMD-SMT_YAGEO-YAGEO-AC0603KRX7R7BB105_C3905328.html
footprint CAP-0603 (0603 (1608M) Capacitor)
pins: 1, 2

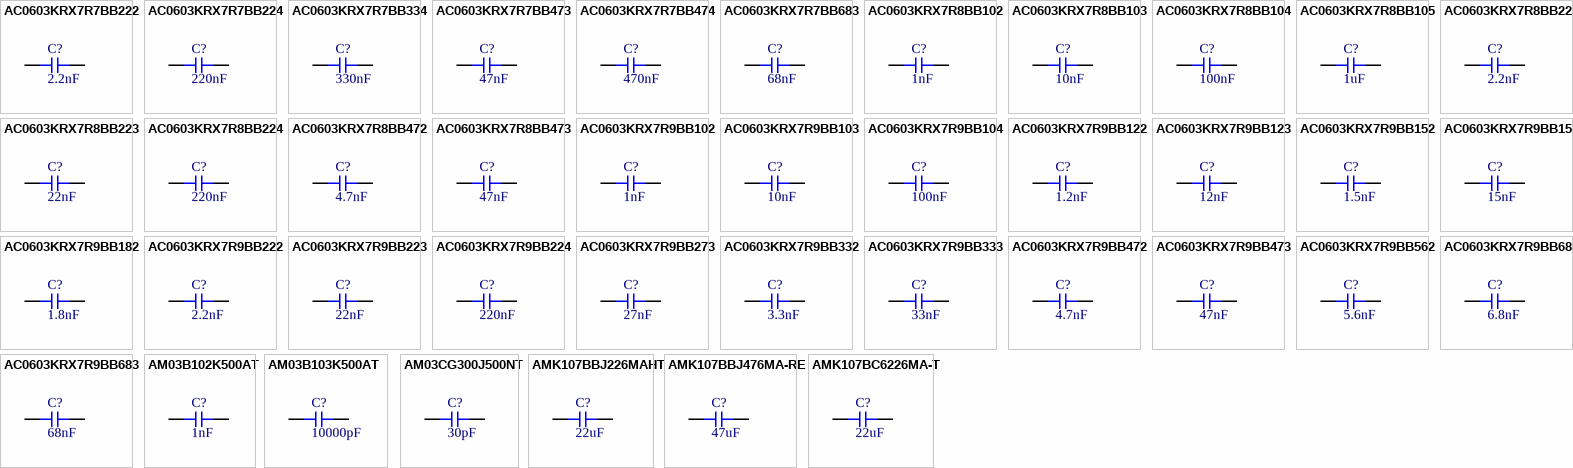
[diagram p26: symbols AC0603KRX7R7BB222 to AMK107BC6226MA-T]

## AC0603KRX7R7BB222
designator C?  Capacitance: 2.2nF  (hidden comment: *)
Capacitor, Ceramic (MLCC), 2.2nF, ±10%, 16V, X7R, ±10%, SMD 0603; Manufacturer: YAGEO; Manufacturer Part Number: AC0603KRX7R7BB222; Package Size: 0603; JLCPCB Basic Part: No; JLCPCB Part Number: C726555; Supplier 1: LCSC; Category: Capacitors - MLCC; Supplier Part Number 1: C726555; Tolerance: ±10%; Voltage Rating: 16V; Temperature Coefficient: X7R; RoHS: Yes; ComponentLink1Description: Datasheet; ComponentLink1URL: https://wmsc.lcsc.com/wmsc/upload/file/pdf/v2/lcsc/2012141239_YAGEO-AC0603KRX7R7BB222_C726555.pdf; ComponentLink2Description: JLCPCB Part URL; ComponentLink2URL: https://jlcpcb.com/partdetail/C726555; ComponentLink3Description: LCSC Part URL; ComponentLink3URL: https://lcsc.com/product-detail/Multilayer-Ceramic-Capacitors-MLCC---SMD-SMT_YAGEO-YAGEO-AC0603KRX7R7BB222_C726555.html
footprint CAP-0603 (0603 (1608M) Capacitor)
pins: 1, 2

## AC0603KRX7R7BB224
designator C?  Capacitance: 220nF  (hidden comment: *)
Capacitor, Ceramic (MLCC), 220nF, ±10%, 16V, X7R, ±10%, SMD 0603; Manufacturer: YAGEO; Manufacturer Part Number: AC0603KRX7R7BB224; Package Size: 0603; JLCPCB Basic Part: No; JLCPCB Part Number: C149611; Supplier 1: LCSC; Category: Capacitors - MLCC; Supplier Part Number 1: C149611; Tolerance: ±10%; Voltage Rating: 16V; Temperature Coefficient: X7R; RoHS: Yes; ComponentLink1Description: Datasheet; ComponentLink1URL: https://wmsc.lcsc.com/wmsc/upload/file/pdf/v2/lcsc/2304140030_YAGEO-AC0603KRX7R7BB224_C149611.pdf; ComponentLink2Description: JLCPCB Part URL; ComponentLink2URL: https://jlcpcb.com/partdetail/C149611; ComponentLink3Description: LCSC Part URL; ComponentLink3URL: https://lcsc.com/product-detail/Multilayer-Ceramic-Capacitors-MLCC---SMD-SMT_YAGEO-YAGEO-AC0603KRX7R7BB224_C149611.html
footprint CAP-0603 (0603 (1608M) Capacitor)
pins: 1, 2

## AC0603KRX7R7BB334
designator C?  Capacitance: 330nF  (hidden comment: *)
Capacitor, Ceramic (MLCC), 330nF, ±10%, 16V, X7R, ±10%, SMD 0603; Manufacturer: YAGEO; Manufacturer Part Number: AC0603KRX7R7BB334; Package Size: 0603; JLCPCB Basic Part: No; JLCPCB Part Number: C726556; Supplier 1: LCSC; Category: Capacitors - MLCC; Supplier Part Number 1: C726556; Tolerance: ±10%; Voltage Rating: 16V; Temperature Coefficient: X7R; RoHS: Yes; ComponentLink1Description: Datasheet; ComponentLink1URL: https://wmsc.lcsc.com/wmsc/upload/file/pdf/v2/lcsc/2009181007_YAGEO-AC0603KRX7R7BB334_C726556.pdf; ComponentLink2Description: JLCPCB Part URL; ComponentLink2URL: https://jlcpcb.com/partdetail/C726556; ComponentLink3Description: LCSC Part URL; ComponentLink3URL: https://lcsc.com/product-detail/Multilayer-Ceramic-Capacitors-MLCC---SMD-SMT_YAGEO-YAGEO-AC0603KRX7R7BB334_C726556.html
footprint CAP-0603 (0603 (1608M) Capacitor)
pins: 1, 2

## AC0603KRX7R7BB473
designator C?  Capacitance: 47nF  (hidden comment: *)
Capacitor, Ceramic (MLCC), 47nF, ±10%, 16V, X7R, ±10%, SMD 0603; Manufacturer: YAGEO; Manufacturer Part Number: AC0603KRX7R7BB473; Package Size: 0603; JLCPCB Basic Part: No; JLCPCB Part Number: C2171649; Supplier 1: LCSC; Category: Capacitors - MLCC; Supplier Part Number 1: C2171649; Tolerance: ±10%; Voltage Rating: 16V; Temperature Coefficient: X7R; RoHS: Yes; ComponentLink1Description: Datasheet; ComponentLink1URL: https://wmsc.lcsc.com/wmsc/upload/file/pdf/v2/lcsc/2202040530_YAGEO-AC0603KRX7R7BB473_C2171649.pdf; ComponentLink2Description: JLCPCB Part URL; ComponentLink2URL: https://jlcpcb.com/partdetail/C2171649; ComponentLink3Description: LCSC Part URL; ComponentLink3URL: https://lcsc.com/product-detail/Multilayer-Ceramic-Capacitors-MLCC---SMD-SMT_YAGEO-YAGEO-AC0603KRX7R7BB473_C2171649.html
footprint CAP-0603 (0603 (1608M) Capacitor)
pins: 1, 2

## AC0603KRX7R7BB474
designator C?  Capacitance: 470nF  (hidden comment: *)
Capacitor, Ceramic (MLCC), 470nF, ±10%, 16V, X7R, ±10%, SMD 0603; Manufacturer: YAGEO; Manufacturer Part Number: AC0603KRX7R7BB474; Package Size: 0603; JLCPCB Basic Part: No; JLCPCB Part Number: C726557; Supplier 1: LCSC; Category: Capacitors - MLCC; Supplier Part Number 1: C726557; Tolerance: ±10%; Voltage Rating: 16V; Temperature Coefficient: X7R; RoHS: Yes; ComponentLink1Description: Datasheet; ComponentLink1URL: https://wmsc.lcsc.com/wmsc/upload/file/pdf/v2/lcsc/2009181007_YAGEO-AC0603KRX7R7BB474_C726557.pdf; ComponentLink2Description: JLCPCB Part URL; ComponentLink2URL: https://jlcpcb.com/partdetail/C726557; ComponentLink3Description: LCSC Part URL; ComponentLink3URL: https://lcsc.com/product-detail/Multilayer-Ceramic-Capacitors-MLCC---SMD-SMT_YAGEO-YAGEO-AC0603KRX7R7BB474_C726557.html
footprint CAP-0603 (0603 (1608M) Capacitor)
pins: 1, 2

## AC0603KRX7R7BB683
designator C?  Capacitance: 68nF  (hidden comment: *)
Capacitor, Ceramic (MLCC), 68nF, ±10%, 16V, X7R, ±10%, SMD 0603; Manufacturer: YAGEO; Manufacturer Part Number: AC0603KRX7R7BB683; Package Size: 0603; JLCPCB Basic Part: No; JLCPCB Part Number: C2192243; Supplier 1: LCSC; Category: Capacitors - MLCC; Supplier Part Number 1: C2192243; Tolerance: ±10%; Voltage Rating: 16V; Temperature Coefficient: X7R; RoHS: Yes; ComponentLink1Description: Datasheet; ComponentLink1URL: https://wmsc.lcsc.com/wmsc/upload/file/pdf/v2/lcsc/2304140030_YAGEO-AC0603KRX7R7BB683_C2192243.pdf; ComponentLink2Description: JLCPCB Part URL; ComponentLink2URL: https://jlcpcb.com/partdetail/C2192243; ComponentLink3Description: LCSC Part URL; ComponentLink3URL: https://lcsc.com/product-detail/Multilayer-Ceramic-Capacitors-MLCC---SMD-SMT_YAGEO-YAGEO-AC0603KRX7R7BB683_C2192243.html
footprint CAP-0603 (0603 (1608M) Capacitor)
pins: 1, 2

## AC0603KRX7R8BB102
designator C?  Capacitance: 1nF  (hidden comment: *)
Capacitor, Ceramic (MLCC), 1nF, ±10%, 25V, X7R, ±10%, SMD 0603; Manufacturer: YAGEO; Manufacturer Part Number: AC0603KRX7R8BB102; Package Size: 0603; JLCPCB Basic Part: No; JLCPCB Part Number: C726558; Supplier 1: LCSC; Category: Capacitors - MLCC; Supplier Part Number 1: C726558; Tolerance: ±10%; Voltage Rating: 25V; Temperature Coefficient: X7R; RoHS: Yes; ComponentLink1Description: Datasheet; ComponentLink1URL: https://wmsc.lcsc.com/wmsc/upload/file/pdf/v2/lcsc/2012011712_YAGEO-AC0603KRX7R8BB102_C726558.pdf; ComponentLink2Description: JLCPCB Part URL; ComponentLink2URL: https://jlcpcb.com/partdetail/C726558; ComponentLink3Description: LCSC Part URL; ComponentLink3URL: https://lcsc.com/product-detail/Multilayer-Ceramic-Capacitors-MLCC---SMD-SMT_YAGEO-YAGEO-AC0603KRX7R8BB102_C726558.html
footprint CAP-0603 (0603 (1608M) Capacitor)
pins: 1, 2

## AC0603KRX7R8BB103
designator C?  Capacitance: 10nF  (hidden comment: *)
Capacitor, Ceramic (MLCC), 10nF, ±10%, 25V, X7R, ±10%, SMD 0603; Manufacturer: YAGEO; Manufacturer Part Number: AC0603KRX7R8BB103; Package Size: 0603; JLCPCB Basic Part: No; JLCPCB Part Number: C726559; Supplier 1: LCSC; Category: Capacitors - MLCC; Supplier Part Number 1: C726559; Tolerance: ±10%; Voltage Rating: 25V; Temperature Coefficient: X7R; RoHS: Yes; ComponentLink1Description: Datasheet; ComponentLink1URL: https://wmsc.lcsc.com/wmsc/upload/file/pdf/v2/lcsc/2010202005_YAGEO-AC0603KRX7R8BB103_C726559.pdf; ComponentLink2Description: JLCPCB Part URL; ComponentLink2URL: https://jlcpcb.com/partdetail/C726559; ComponentLink3Description: LCSC Part URL; ComponentLink3URL: https://lcsc.com/product-detail/Multilayer-Ceramic-Capacitors-MLCC---SMD-SMT_YAGEO-YAGEO-AC0603KRX7R8BB103_C726559.html
footprint CAP-0603 (0603 (1608M) Capacitor)
pins: 1, 2

## AC0603KRX7R8BB104
designator C?  Capacitance: 100nF  (hidden comment: *)
Capacitor, Ceramic (MLCC), 100nF, ±10%, 25V, X7R, ±10%, SMD 0603; Manufacturer: YAGEO; Manufacturer Part Number: AC0603KRX7R8BB104; Package Size: 0603; JLCPCB Basic Part: No; JLCPCB Part Number: C327096; Supplier 1: LCSC; Category: Capacitors - MLCC; Supplier Part Number 1: C327096; Tolerance: ±10%; Voltage Rating: 25V; Temperature Coefficient: X7R; RoHS: Yes; ComponentLink1Description: Datasheet; ComponentLink1URL: https://wmsc.lcsc.com/wmsc/upload/file/pdf/v2/lcsc/1811141226_YAGEO-AC0603KRX7R8BB104_C327096.pdf; ComponentLink2Description: JLCPCB Part URL; ComponentLink2URL: https://jlcpcb.com/partdetail/C327096; ComponentLink3Description: LCSC Part URL; ComponentLink3URL: https://lcsc.com/product-detail/Multilayer-Ceramic-Capacitors-MLCC---SMD-SMT_YAGEO-YAGEO-AC0603KRX7R8BB104_C327096.html
footprint CAP-0603 (0603 (1608M) Capacitor)
pins: 1, 2

## AC0603KRX7R8BB105
designator C?  Capacitance: 1uF  (hidden comment: *)
Capacitor, Ceramic (MLCC), 1uF, ±10%, 25V, X7R, ±10%, SMD 0603; Manufacturer: YAGEO; Manufacturer Part Number: AC0603KRX7R8BB105; Package Size: 0603; JLCPCB Basic Part: No; JLCPCB Part Number: C726560; Supplier 1: LCSC; Category: Capacitors - MLCC; Supplier Part Number 1: C726560; Tolerance: ±10%; Voltage Rating: 25V; Temperature Coefficient: X7R; RoHS: Yes; ComponentLink1Description: Datasheet; ComponentLink1URL: https://wmsc.lcsc.com/wmsc/upload/file/pdf/v2/lcsc/2010221004_YAGEO-AC0603KRX7R8BB105_C726560.pdf; ComponentLink2Description: JLCPCB Part URL; ComponentLink2URL: https://jlcpcb.com/partdetail/C726560; ComponentLink3Description: LCSC Part URL; ComponentLink3URL: https://lcsc.com/product-detail/Multilayer-Ceramic-Capacitors-MLCC---SMD-SMT_YAGEO-YAGEO-AC0603KRX7R8BB105_C726560.html
footprint CAP-0603 (0603 (1608M) Capacitor)
pins: 1, 2
